# Altium footprint library BASIC.PcbLib: 244 footprints (part 9 of 16)
Each footprint in its own frame and in the unit in brackets; x right, y up, seen from the top. Pads: shape width x height; smd on the part's side, far side on the other; paste and mask are expansions set on the pad; w line width, h text height; cw(c..) or ccw(c..) is an arc to the next point about the centre after c.
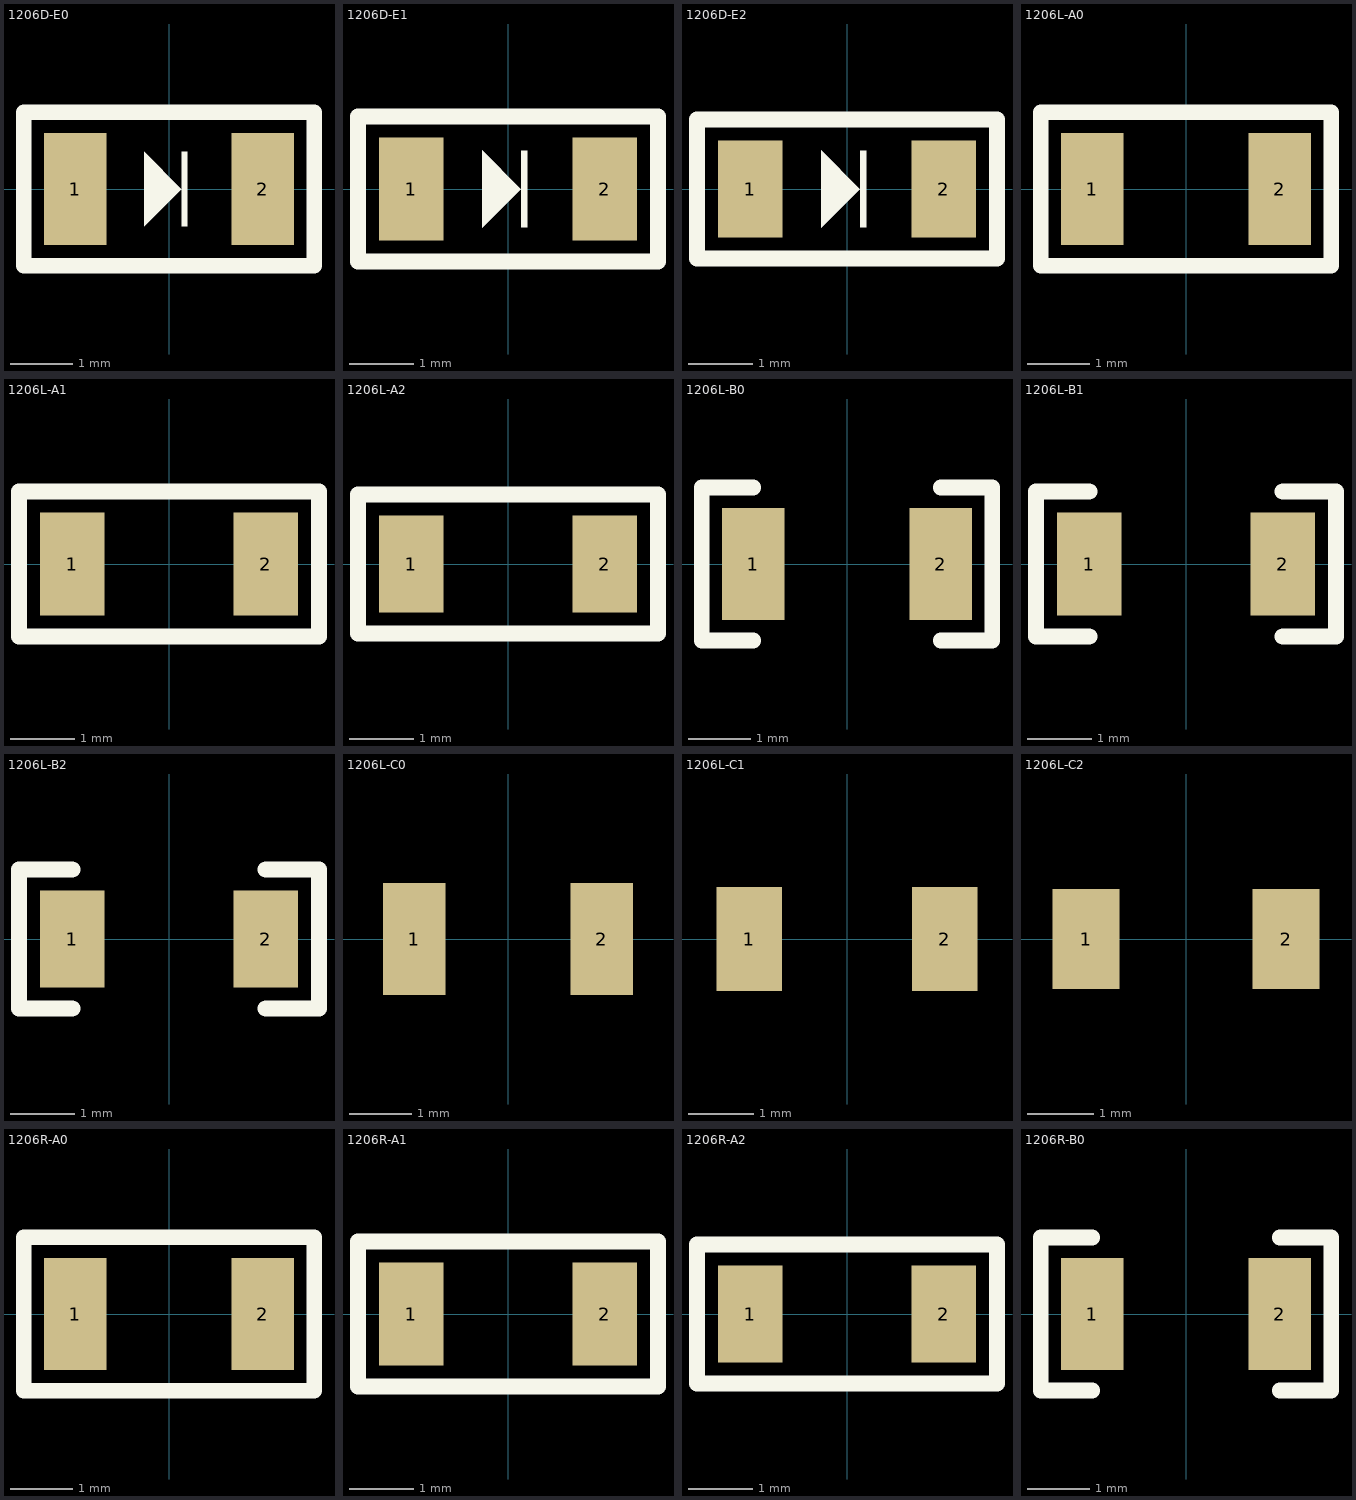
[diagram p8: the footprints below, top view; thin cyan lines are the x and y axes]

## 1206D-E0 [mm]
pads (2):
  rect 1x1.8 smd: 1(-1.5,0) 2(1.5,0)
Top Overlay:
  rectangle: 0.2,-0.6 0.3,0.6
  region: -0.4,0.6 -0.4,-0.6 0.2,0
  lines w0.25: -2.325,-1.225 2.325,-1.225 2.325,1.225 -2.325,1.225 -2.325,-1.225
3D body "1206R.stp": height 0.6, standoff 0, extent -1.6,-0.8 1.6,0.8

## 1206D-E1 [mm]
pads (2):
  rect 1x1.6 smd: 1(-1.5,0) 2(1.5,0)
Top Overlay:
  rectangle: 0.2,-0.6 0.3,0.6
  region: -0.4,0.6 -0.4,-0.6 0.2,0
  lines w0.25: -2.325,-1.125 -2.325,1.125 2.325,1.125 2.325,-1.125 -2.325,-1.125
3D body "1206R.stp": height 0.6, standoff 0, extent -1.6,-0.8 1.6,0.8

## 1206D-E2 [mm]
pads (2):
  rect 1x1.5 smd: 1(-1.5,0) 2(1.5,0)
Top Overlay:
  rectangle: 0.2,-0.6 0.3,0.6
  region: -0.4,0.6 -0.4,-0.6 0.2,0
  lines w0.25: -2.325,-1.075 -2.325,1.075 2.325,1.075 2.325,-1.075 -2.325,-1.075
3D body "1206R.stp": height 0.6, standoff 0, extent -1.6,-0.8 1.6,0.8

## 1206L-A0 [mm]
pads (2):
  rect 1x1.8 smd: 1(-1.5,0) 2(1.5,0)
Top Overlay:
  lines w0.25: -2.325,-1.225 -2.325,1.225 2.325,1.225 2.325,-1.225 -2.325,-1.225
3D body "1206R.stp": height 0.6, standoff 0, extent -1.6,-0.8 1.6,0.8

## 1206L-A1 [mm]
pads (2):
  rect 1x1.6 smd: 1(-1.5,0) 2(1.5,0)
Top Overlay:
  lines w0.25: -2.325,-1.125 2.325,-1.125 2.325,1.125 -2.325,1.125 -2.325,-1.125
3D body "1206R.stp": height 0.6, standoff 0, extent -1.6,-0.8 1.6,0.8

## 1206L-A2 [mm]
pads (2):
  rect 1x1.5 smd: 1(-1.5,0) 2(1.5,0)
Top Overlay:
  lines w0.25: -2.325,-1.075 -2.325,1.075 2.325,1.075 2.325,-1.075 -2.325,-1.075
3D body "1206R.stp": height 0.6, standoff 0, extent -1.6,-0.8 1.6,0.8

## 1206L-B0 [mm]
pads (2):
  rect 1x1.8 smd: 1(-1.5,0) 2(1.5,0)
Top Overlay:
  lines w0.25: -1.5,-1.225 -2.325,-1.225 -2.325,1.225 -1.5,1.225 ; 1.5,-1.225 2.325,-1.225 2.325,1.225 1.5,1.225
3D body "1206R.stp": height 0.6, standoff 0, extent -1.6,-0.8 1.6,0.8

## 1206L-B1 [mm]
pads (2):
  rect 1x1.6 smd: 1(-1.5,0) 2(1.5,0)
Top Overlay:
  lines w0.25: -1.5,-1.125 -2.325,-1.125 -2.325,1.125 -1.5,1.125 ; 1.5,-1.125 2.325,-1.125 2.325,1.125 1.5,1.125
3D body "1206R.stp": height 0.6, standoff 0, extent -1.6,-0.8 1.6,0.8

## 1206L-B2 [mm]
pads (2):
  rect 1x1.5 smd: 1(-1.5,0) 2(1.5,0)
Top Overlay:
  lines w0.25: -1.5,-1.075 -2.325,-1.075 -2.325,1.075 -1.5,1.075 ; 1.5,-1.075 2.325,-1.075 2.325,1.075 1.5,1.075
3D body "1206R.stp": height 0.6, standoff 0, extent -1.6,-0.8 1.6,0.8

## 1206L-C0 [mm]
pads (2):
  rect 1x1.8 smd: 1(-1.5,0) 2(1.5,0)
3D body "1206R.stp": height 0.6, standoff 0, extent -1.6,-0.8 1.6,0.8

## 1206L-C1 [mm]
pads (2):
  rect 1x1.6 smd: 1(-1.5,0) 2(1.5,0)
3D body "1206R.stp": height 0.6, standoff 0, extent -1.6,-0.8 1.6,0.8

## 1206L-C2 [mm]
pads (2):
  rect 1x1.5 smd: 1(-1.5,0) 2(1.5,0)
3D body "1206R.stp": height 0.6, standoff 0, extent -1.6,-0.8 1.6,0.8

## 1206R-A0 [mm]
pads (2):
  rect 1x1.8 smd: 1(-1.5,0) 2(1.5,0)
Top Overlay:
  lines w0.25: -2.325,-1.225 -2.325,1.225 2.325,1.225 2.325,-1.225 -2.325,-1.225
3D body "1206R.stp": height 0.6, standoff 0, extent -1.6,-0.8 1.6,0.8

## 1206R-A1 [mm]
pads (2):
  rect 1x1.6 smd: 1(-1.5,0) 2(1.5,0)
Top Overlay:
  lines w0.25: -2.325,-1.125 -2.325,1.125 2.325,1.125 2.325,-1.125 -2.325,-1.125
3D body "1206R.stp": height 0.6, standoff 0, extent -1.6,-0.8 1.6,0.8

## 1206R-A2 [mm]
pads (2):
  rect 1x1.5 smd: 1(-1.5,0) 2(1.5,0)
Top Overlay:
  lines w0.25: -2.325,-1.075 2.325,-1.075 2.325,1.075 -2.325,1.075 -2.325,-1.075
3D body "1206R.stp": height 0.6, standoff 0, extent -1.6,-0.8 1.6,0.8

## 1206R-B0 [mm]
pads (2):
  rect 1x1.8 smd: 1(-1.5,0) 2(1.5,0)
Top Overlay:
  lines w0.25: -1.5,-1.225 -2.325,-1.225 -2.325,1.225 -1.5,1.225 ; 1.5,-1.225 2.325,-1.225 2.325,1.225 1.5,1.225
3D body "1206R.stp": height 0.6, standoff 0, extent -1.6,-0.8 1.6,0.8